# Altium footprint library Lib.PcbLib: 177 footprints (part 1 of 12)
Each footprint in its own frame and in the unit in brackets; x right, y up, seen from the top. Pads: shape width x height; smd on the part's side, far side on the other; paste and mask are expansions set on the pad; w line width, h text height; cw(c..) or ccw(c..) is an arc to the next point about the centre after c.
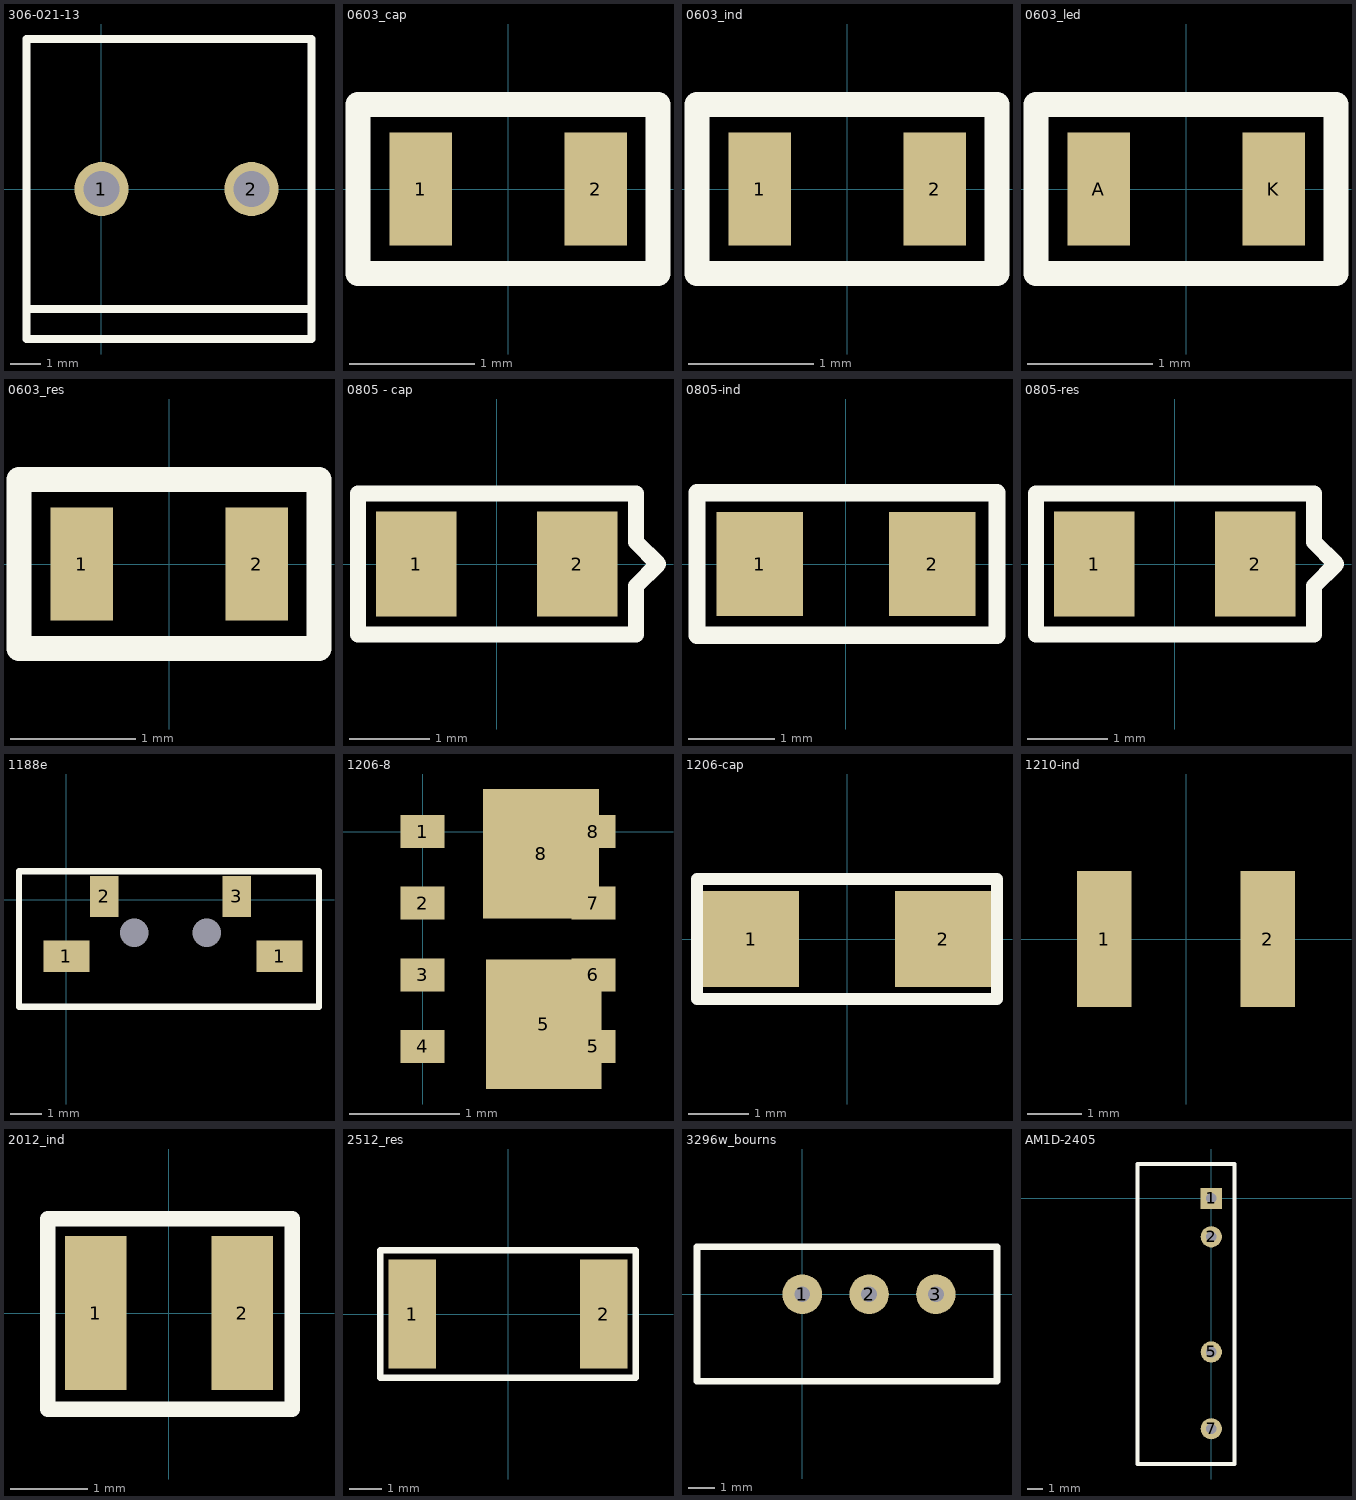
[diagram p0: the footprints below, top view; thin cyan lines are the x and y axes]

## 306-021-13 [mm]
pads (2):
  round 1.8 hole 1.2: 1(0,0) 2(5,0)
Top Overlay:
  lines w0.254: -2.5,-4 7,-4 ; -2.5,-5 7,-5 7,5 -2.5,5 -2.5,-5
3D body "User Library-DT126VP-02P.STEP": height 10.7, standoff -1.7, extent -2.75,-3.3 7.5,4.5

## 0603_cap [mm]
pads (2):
  rect 0.5x0.9 smd: 1(-0.7,0) 2(0.7,0)
Top Overlay:
  lines w0.2: -1.2,-0.675 1.2,-0.675 1.2,0.675 -1.2,0.675 -1.2,-0.675
3D body "SW3dPS-0603 SMD Capacitor.STEP": height 0.3, standoff 0, extent -0.8,-0.4 0.8,0.4

## 0603_ind [mm]
pads (2):
  rect 0.5x0.9 smd: 1(-0.7,0) 2(0.7,0)
Top Overlay:
  lines w0.2: -1.2,-0.675 -1.2,0.675 1.2,0.675 1.2,-0.675 -1.2,-0.675
3D body "User Library-FB_1608.STEP": height 0.8, standoff 0, extent -0.8,-0.4 0.8,0.4

## 0603_led [mm]
pads (2):
  rect 0.5x0.9 smd: A(-0.7,0) K(0.7,0)
Top Overlay:
  lines w0.2: -1.2,-0.675 -1.2,0.675 1.2,0.675 1.2,-0.675 -1.2,-0.675
3D body "User Library-LED_0603_G.STEP": height 0.6, standoff 0, extent -0.8,-0.4 0.8,0.4

## 0603_res [mm]
pads (2):
  rect 0.5x0.9 smd: 1(-0.7,0) 2(0.7,0)
Top Overlay:
  lines w0.2: -1.2,-0.675 1.2,-0.675 1.2,0.675 -1.2,0.675 -1.2,-0.675
3D body "User Library-RES_1609-0603.STEP": height 0.56, standoff 0, extent -0.85,-0.4 0.85,0.4

## 0805 - cap [mm]
pads (2):
  rect 1x1.3 smd: 1(-1,0) 2(1,0)
Top Overlay:
  lines w0.2: -1.725,-0.875 -1.725,0.875 1.725,0.875 1.725,0.275 2,0 1.725,-0.275 1.725,-0.875 -1.725,-0.875
3D body "SW3dPS-0805 SMD Capacitor.STEP": height 0.78, standoff 0, extent -1,-0.625 1,0.625

## 0805-ind [mm]
pads (2):
  rect 1x1.2 smd: 1(-1,0) 2(1,0)
Top Overlay:
  lines w0.2: -1.725,-0.225 -1.725,-0.225 ; -1.725,-0.225 -1.725,-0.825 1.75,-0.825 1.75,0.825 -1.725,0.825 -1.725,-0.225
3D body "User Library-ind_0805.step": height 0.95, standoff 0, extent -1,-0.6 1,0.6

## 0805-res [mm]
pads (2):
  rect 1x1.3 smd: 1(-1,0) 2(1,0)
Top Overlay:
  lines w0.2: -1.725,-0.875 1.725,-0.875 1.725,-0.275 2,0 1.725,0.275 1.725,0.875 -1.725,0.875 -1.725,-0.875
3D body "User Library-RES_2013-0805.STEP": height 0.76, standoff 0, extent -1.15,-0.675 1.15,0.675

## 1188e [mm]
pads (6):
  rect 1.45x1 smd: 1(0,-1.8) 1(6.75,-1.8)
  round 0 hole 0.9: 1(2.15,-1.05) 1(4.45,-1.05)
  rect 0.9x1.3 smd: 2(1.2,0.1) 3(5.4,0.1)
Top Overlay:
  lines w0.2: 2.8,0.9 8,0.9 8,-3.4 -1.5,-3.4 -1.5,0.9 2.925,0.9
3D body "User Library-it-1188e.STEP": height 3.5, standoff -0.7, extent -0.598,-3.25 7.202,0.35

## 1206-8 [mm]
pads (10):
  rect 0.4x0.3 smd: 1(0,0) 2(0,-0.65) 3(0,-1.3) 4(0,-1.95) 5(1.55,-1.95) 6(1.55,-1.3) 7(1.55,-0.65) 8(1.55,0)
  rect 1.05x1.175 smd: 5(1.1,-1.75) 8(1.075,-0.2)
3D body: height 0.75, standoff 0, extent -0.2,-2.5 1.7,0.5

## 1206-cap [mm]
pads (2):
  rect 1.6x1.6 smd: 1(-1.6,0) 2(1.6,0)
Top Overlay:
  lines w0.2: -2.5,-1 -2.5,1 2.5,1 2.5,-1 -2.5,-1
3D body "SW3dPS-1206 SMD Capacitor.STEP": height 1, standoff 0, extent -1.6,-0.8 1.6,0.8

## 1210-ind [mm]
pads (2):
  rect 1x2.5 smd: 1(-1.5,0) 2(1.5,0)
3D body "User Library-Chip InductorINDC3225X135N.STEP": height 1.35, standoff 0, extent -1.6,-1.25 1.6,1.25

## 2012_ind [mm]
pads (2):
  rect 0.8x2 smd: 1(-0.95,0) 2(0.95,0)
Top Overlay:
  lines w0.2: -1.575,-1.25 1.6,-1.25 1.6,1.225 -1.575,1.225 -1.575,-0.525 -1.575,-1.25
3D body "User Library-Chip Inductor.step": height 1.3, standoff 0, extent -1.05,-0.6 0.95,0.6

## 2512_res [mm]
pads (2):
  rect 1.5x3.4 smd: 1(-3,0) 2(3,0)
Top Overlay:
  lines w0.2: -4,-2 -4,2 4,2 4,-2 -4,-2
3D body "CircuitWorks-RESISTOR 2512.step": height 0.58, standoff -0.03, extent -3.175,-1.63 3.175,1.63

## 3296w_bourns [mm]
pads (3):
  round 1.5 hole 0.6: 1(0,0) 2(2.54,0) 3(5.08,0)
Top Overlay:
  lines w0.254: -4,-3.3 7.4,-3.3 7.4,1.8 -4,1.8 -4,-3.3
3D body "User Library-3296W-2.step": height 10.13, standoff -4.3, extent -3.84,-3.15 7.29,1.68
3D body: height 0.25, standoff 0, extent -2.54,0 -2.54,0

## AM1D-2405 [mm]
pads (4):
  rect 1.4x1.4 hole 0.7: 1(0,0)
  round 1.4 hole 0.7: 2(0,-2.54) 5(0,-10.16) 7(0,-15.24)
Top Overlay:
  lines w0.254: -4.872,-17.572 1.528,-17.572 1.528,2.275 -4.872,2.275 -4.872,-17.572
3D body "User Library-AM1D-0505S.step": height 10, standoff -3.05, extent -4.673,-17.425 1.337,2.075